# Altium schematic symbol library WR-TBL_Pluggable PCB Header.SchLib: 719 symbols (part 4 of 5)
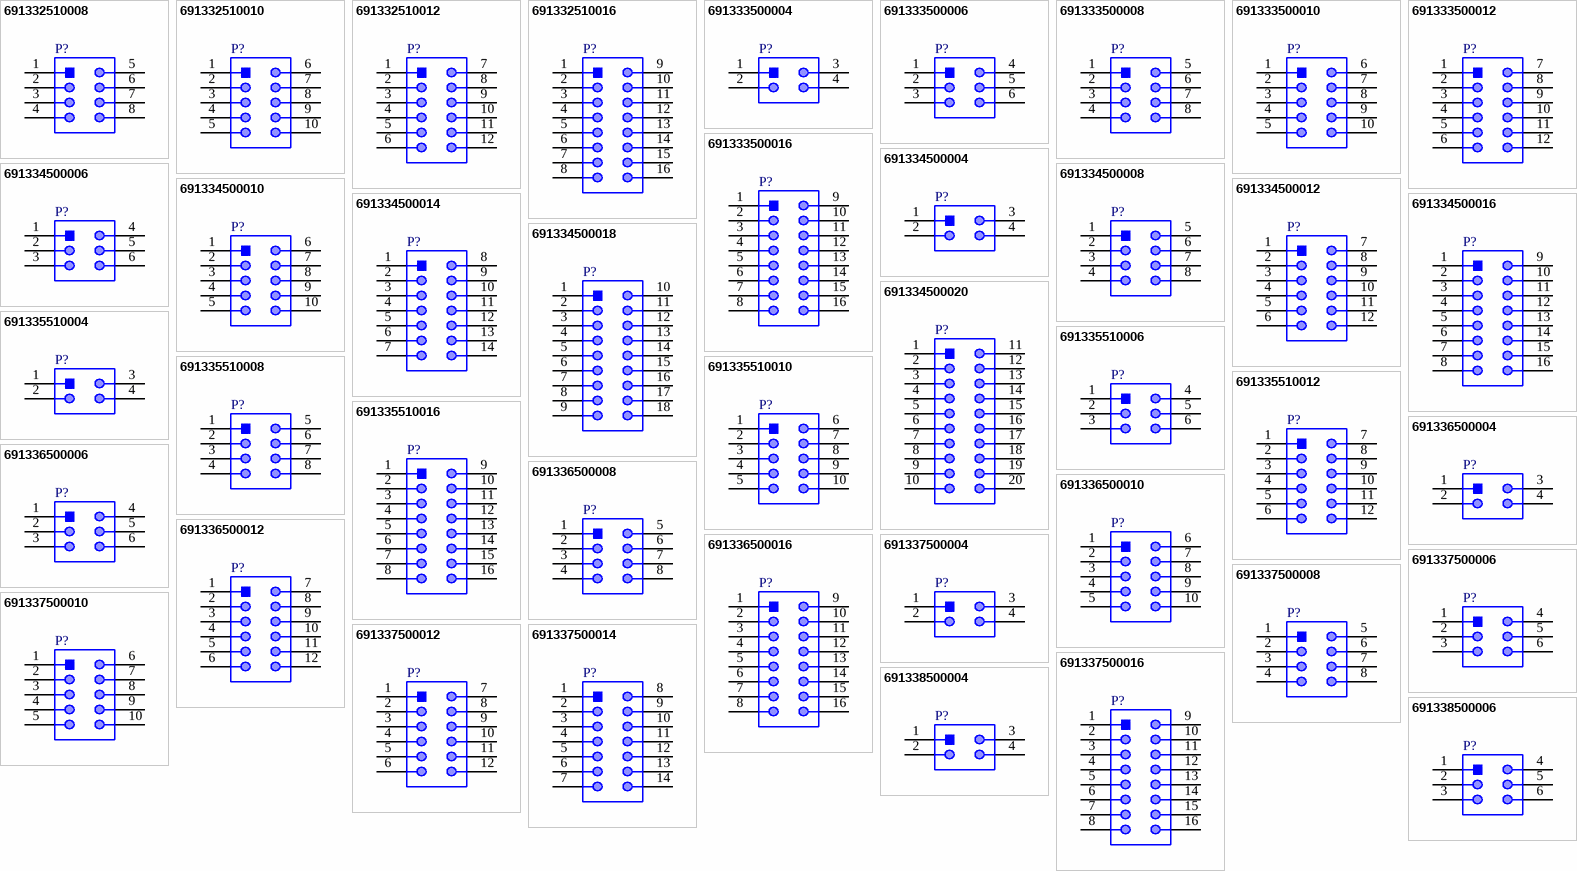
[diagram p20: symbols 691332510008 to 691338500006]

## 691334500020
designator P?
WR-TBL Serie 3345 Double Level Vertical PCB Header with Flanges & Nut Type, Pluggable, pitch 5.08mm, 20p; Part Number: 691334500020; Compliance: RoHS; Modularity: No; Pin Number: 20; Rated Current [UL]: 20A; Working Voltage [UL]: 300VAC; ComponentLink1Description: Manufacturer; ComponentLink1URL: http://www.we-online.de; ComponentLink2URL: https://katalog.we-online.de/em/datasheet/691334500020.pdf; ComponentLink2Description: Datasheet; Mounting Technology: THT; Packaging: Box; Operating Temperature: -40 to +105degC; PCB/Cable/Panel: PCB; Pitch: 5.08mm; Published Date: October 2019; Type: Double Level Vertical; Publisher: Wurth Elektronik; Application: Pluggable
footprint 691334500020
pins: 1, 2, 3, 4, 5, 6, 7, 8, 9, 10, 11, 12, 13, 14, 15, 16, 17, 18, 19, 20

## 691335510004
designator P?
WR-TBL Serie 3355 Double Level Horizontal PCB Header Modular, Pluggable, pitch 5.08mm, 4p; Part Number: 691335510004; Compliance: RoHS; Modularity: Yes; Pin Number: 4; Rated Current [UL]: 10A; Working Voltage [UL]: 300VAC; ComponentLink1Description: Manufacturer; ComponentLink1URL: http://www.we-online.de; ComponentLink2URL: https://katalog.we-online.de/em/datasheet/691335510004.pdf; ComponentLink2Description: Datasheet; Mounting Technology: THT; Packaging: Box; Operating Temperature: -40 to +105degC; PCB/Cable/Panel: PCB; Pitch: 5.08mm; Published Date: October 2019; Type: Double Level Horizontal; Publisher: Wurth Elektronik; Application: Pluggable
footprint 691335510004
pins: 1, 2, 3, 4

## 691335510006
designator P?
WR-TBL Serie 3355 Double Level Horizontal PCB Header Modular, Pluggable, pitch 5.08mm, 6p; Part Number: 691335510006; Compliance: RoHS; Modularity: Yes; Pin Number: 6; Rated Current [UL]: 10A; Working Voltage [UL]: 300VAC; ComponentLink1Description: Manufacturer; ComponentLink1URL: http://www.we-online.de; ComponentLink2URL: https://katalog.we-online.de/em/datasheet/691335510006.pdf; ComponentLink2Description: Datasheet; Mounting Technology: THT; Packaging: Box; Operating Temperature: -40 to +105degC; PCB/Cable/Panel: PCB; Pitch: 5.08mm; Published Date: October 2019; Type: Double Level Horizontal; Publisher: Wurth Elektronik; Application: Pluggable
footprint 691335510006
pins: 1, 2, 3, 4, 5, 6

## 691335510008
designator P?
WR-TBL Serie 3355 Double Level Horizontal PCB Header Modular, Pluggable, pitch 5.08mm, 8p; Part Number: 691335510008; Compliance: RoHS; Modularity: Yes; Pin Number: 8; Rated Current [UL]: 10A; Working Voltage [UL]: 300VAC; ComponentLink1Description: Manufacturer; ComponentLink1URL: http://www.we-online.de; ComponentLink2URL: https://katalog.we-online.de/em/datasheet/691335510008.pdf; ComponentLink2Description: Datasheet; Mounting Technology: THT; Packaging: Box; Operating Temperature: -40 to +105degC; PCB/Cable/Panel: PCB; Pitch: 5.08mm; Published Date: October 2019; Type: Double Level Horizontal; Publisher: Wurth Elektronik; Application: Pluggable
footprint 691335510008
pins: 1, 2, 3, 4, 5, 6, 7, 8

## 691335510010
designator P?
WR-TBL Serie 3355 Double Level Horizontal PCB Header Modular, Pluggable, pitch 5.08mm, 10p; Part Number: 691335510010; Compliance: RoHS; Modularity: Yes; Pin Number: 10; Rated Current [UL]: 10A; Working Voltage [UL]: 300VAC; ComponentLink1Description: Manufacturer; ComponentLink1URL: http://www.we-online.de; ComponentLink2URL: https://katalog.we-online.de/em/datasheet/691335510010.pdf; ComponentLink2Description: Datasheet; Mounting Technology: THT; Packaging: Box; Operating Temperature: -40 to +105degC; PCB/Cable/Panel: PCB; Pitch: 5.08mm; Published Date: October 2019; Type: Double Level Horizontal; Publisher: Wurth Elektronik; Application: Pluggable
footprint 691335510010
pins: 1, 2, 3, 4, 5, 6, 7, 8, 9, 10

## 691335510012
designator P?
WR-TBL Serie 3355 Double Level Horizontal PCB Header Modular, Pluggable, pitch 5.08mm, 12p; Part Number: 691335510012; Compliance: RoHS; Modularity: Yes; Pin Number: 12; Rated Current [UL]: 10A; Working Voltage [UL]: 300VAC; ComponentLink1Description: Manufacturer; ComponentLink1URL: http://www.we-online.de; ComponentLink2URL: https://katalog.we-online.de/em/datasheet/691335510012.pdf; ComponentLink2Description: Datasheet; Mounting Technology: THT; Packaging: Box; Operating Temperature: -40 to +105degC; PCB/Cable/Panel: PCB; Pitch: 5.08mm; Published Date: October 2019; Type: Double Level Horizontal; Publisher: Wurth Elektronik; Application: Pluggable
footprint 691335510012
pins: 1, 2, 3, 4, 5, 6, 7, 8, 9, 10, 11, 12

## 691335510016
designator P?
WR-TBL Serie 3355 Double Level Horizontal PCB Header Modular, Pluggable, pitch 5.08mm, 16p; Part Number: 691335510016; Compliance: RoHS; Modularity: Yes; Pin Number: 16; Rated Current [UL]: 10A; Working Voltage [UL]: 300VAC; ComponentLink1Description: Manufacturer; ComponentLink1URL: http://www.we-online.de; ComponentLink2URL: https://katalog.we-online.de/em/datasheet/691335510016.pdf; ComponentLink2Description: Datasheet; Mounting Technology: THT; Packaging: Box; Operating Temperature: -40 to +105degC; PCB/Cable/Panel: PCB; Pitch: 5.08mm; Published Date: October 2019; Type: Double Level Horizontal; Publisher: Wurth Elektronik; Application: Pluggable
footprint 691335510016
pins: 1, 2, 3, 4, 5, 6, 7, 8, 9, 10, 11, 12, 13, 14, 15, 16

## 691336500004
designator P?
WR-TBL Serie 3365 Double Level Vertical Header with Flanges, Pluggable, pitch 5.08mm, 4p; Part Number: 691336500004; Compliance: RoHS; Modularity: No; PCB/Cable/Panel: PCB; Pin Number: 4; Rated Current [UL]: 15A; Working Voltage [UL]: 300VAC; ComponentLink1Description: Manufacturer; ComponentLink1URL: http://www.we-online.de; ComponentLink2URL: https://katalog.we-online.de/em/datasheet/691336500004.pdf; ComponentLink2Description: Datasheet; Mounting Technology: THT; Packaging: Box; Operating Temperature: -40 to +105degC; Pitch: 5.08mm; Published Date: October 2019; Type: Double Level Vertical; Publisher: Wurth Elektronik; Application: Pluggable
footprint 691336500004
pins: 1, 2, 3, 4

## 691336500006
designator P?
WR-TBL Serie 3365 Double Level Vertical Header with Flanges, Pluggable, pitch 5.08mm, 6p; Part Number: 691336500006; Compliance: RoHS; Modularity: No; PCB/Cable/Panel: PCB; Pin Number: 6; Rated Current [UL]: 15A; Working Voltage [UL]: 300VAC; ComponentLink1Description: Manufacturer; ComponentLink1URL: http://www.we-online.de; ComponentLink2URL: https://katalog.we-online.de/em/datasheet/691336500006.pdf; ComponentLink2Description: Datasheet; Mounting Technology: THT; Packaging: Box; Operating Temperature: -40 to +105degC; Pitch: 5.08mm; Published Date: October 2019; Type: Double Level Vertical; Publisher: Wurth Elektronik; Application: Pluggable
footprint 691336500006
pins: 1, 2, 3, 4, 5, 6

## 691336500008
designator P?
WR-TBL Serie 3365 Double Level Vertical Header with Flanges, Pluggable, pitch 5.08mm, 8p; Part Number: 691336500008; Compliance: RoHS; Modularity: No; PCB/Cable/Panel: PCB; Pin Number: 8; Rated Current [UL]: 15A; Working Voltage [UL]: 300VAC; ComponentLink1Description: Manufacturer; ComponentLink1URL: http://www.we-online.de; ComponentLink2URL: https://katalog.we-online.de/em/datasheet/691336500008.pdf; ComponentLink2Description: Datasheet; Mounting Technology: THT; Packaging: Box; Operating Temperature: -40 to +105degC; Pitch: 5.08mm; Published Date: October 2019; Type: Double Level Vertical; Publisher: Wurth Elektronik; Application: Pluggable
footprint 691336500008
pins: 1, 2, 3, 4, 5, 6, 7, 8

## 691336500010
designator P?
WR-TBL Serie 3365 Double Level Vertical Header with Flanges, Pluggable, pitch 5.08mm, 10p; Part Number: 691336500010; Compliance: RoHS; Modularity: No; PCB/Cable/Panel: PCB; Pin Number: 10; Rated Current [UL]: 15A; Working Voltage [UL]: 300VAC; ComponentLink1Description: Manufacturer; ComponentLink1URL: http://www.we-online.de; ComponentLink2URL: https://katalog.we-online.de/em/datasheet/691336500010.pdf; ComponentLink2Description: Datasheet; Mounting Technology: THT; Packaging: Box; Operating Temperature: -40 to +105degC; Pitch: 5.08mm; Published Date: October 2019; Type: Double Level Vertical; Publisher: Wurth Elektronik; Application: Pluggable
footprint 691336500010
pins: 1, 2, 3, 4, 5, 6, 7, 8, 9, 10

## 691336500012
designator P?
WR-TBL Serie 3365 Double Level Vertical Header with Flanges, Pluggable, pitch 5.08mm, 12p; Part Number: 691336500012; Compliance: RoHS; Modularity: No; PCB/Cable/Panel: PCB; Pin Number: 12; Rated Current [UL]: 15A; Working Voltage [UL]: 300VAC; ComponentLink1Description: Manufacturer; ComponentLink1URL: http://www.we-online.de; ComponentLink2URL: https://katalog.we-online.de/em/datasheet/691336500012.pdf; ComponentLink2Description: Datasheet; Mounting Technology: THT; Packaging: Box; Operating Temperature: -40 to +105degC; Pitch: 5.08mm; Published Date: October 2019; Type: Double Level Vertical; Publisher: Wurth Elektronik; Application: Pluggable
footprint 691336500012
pins: 1, 2, 3, 4, 5, 6, 7, 8, 9, 10, 11, 12

## 691336500016
designator P?
WR-TBL Serie 3365 Double Level Vertical Header with Flanges, Pluggable, pitch 5.08mm, 16p; Part Number: 691336500016; Compliance: RoHS; Modularity: No; PCB/Cable/Panel: PCB; Pin Number: 16; Rated Current [UL]: 15A; Working Voltage [UL]: 300VAC; ComponentLink1Description: Manufacturer; ComponentLink1URL: http://www.we-online.de; ComponentLink2URL: https://katalog.we-online.de/em/datasheet/691336500016.pdf; ComponentLink2Description: Datasheet; Mounting Technology: THT; Packaging: Box; Operating Temperature: -40 to +105degC; Pitch: 5.08mm; Published Date: October 2019; Type: Double Level Vertical; Publisher: Wurth Elektronik; Application: Pluggable
footprint 691336500016
pins: 1, 2, 3, 4, 5, 6, 7, 8, 9, 10, 11, 12, 13, 14, 15, 16

## 691337500004
designator P?
WR-TBL Serie 3375 Double Level Vertical PCB Header with Flanges & Nut Type, Pluggable, pitch 5.08mm, 4p; Part Number: 691337500004; Compliance: RoHS; Modularity: No; Pin Number: 4; Rated Current [UL]: 10A; Working Voltage [UL]: 300VAC; ComponentLink1Description: Manufacturer; ComponentLink1URL: http://www.we-online.de; ComponentLink2URL: https://katalog.we-online.de/em/datasheet/691337500004.pdf; ComponentLink2Description: Datasheet; Mounting Technology: THT; Packaging: Box; Operating Temperature: -40 to +105degC; PCB/Cable/Panel: PCB; Pitch: 5.08mm; Published Date: October 2019; Type: Double Level Vertical; Publisher: Wurth Elektronik; Application: Pluggable
footprint 691337500004
pins: 1, 2, 3, 4

## 691337500006
designator P?
WR-TBL Serie 3375 Double Level Vertical PCB Header with Flanges & Nut Type, Pluggable, pitch 5.08mm, 6p; Part Number: 691337500006; Compliance: RoHS; Modularity: No; Pin Number: 6; Rated Current [UL]: 10A; Working Voltage [UL]: 300VAC; ComponentLink1Description: Manufacturer; ComponentLink1URL: http://www.we-online.de; ComponentLink2URL: https://katalog.we-online.de/em/datasheet/691337500006.pdf; ComponentLink2Description: Datasheet; Mounting Technology: THT; Packaging: Box; Operating Temperature: -40 to +105degC; PCB/Cable/Panel: PCB; Pitch: 5.08mm; Published Date: October 2019; Type: Double Level Vertical; Publisher: Wurth Elektronik; Application: Pluggable
footprint 691337500006
pins: 1, 2, 3, 4, 5, 6

## 691337500008
designator P?
WR-TBL Serie 3375 Double Level Vertical PCB Header with Flanges & Nut Type, Pluggable, pitch 5.08mm, 8p; Part Number: 691337500008; Compliance: RoHS; Modularity: No; Pin Number: 8; Rated Current [UL]: 10A; Working Voltage [UL]: 300VAC; ComponentLink1Description: Manufacturer; ComponentLink1URL: http://www.we-online.de; ComponentLink2URL: https://katalog.we-online.de/em/datasheet/691337500008.pdf; ComponentLink2Description: Datasheet; Mounting Technology: THT; Packaging: Box; Operating Temperature: -40 to +105degC; PCB/Cable/Panel: PCB; Pitch: 5.08mm; Published Date: October 2019; Type: Double Level Vertical; Publisher: Wurth Elektronik; Application: Pluggable
footprint 691337500008
pins: 1, 2, 3, 4, 5, 6, 7, 8

## 691337500010
designator P?
WR-TBL Serie 3375 Double Level Vertical PCB Header with Flanges & Nut Type, Pluggable, pitch 5.08mm, 10p; Part Number: 691337500010; Compliance: RoHS; Modularity: No; Pin Number: 10; Rated Current [UL]: 10A; Working Voltage [UL]: 300VAC; ComponentLink1Description: Manufacturer; ComponentLink1URL: http://www.we-online.de; ComponentLink2URL: https://katalog.we-online.de/em/datasheet/691337500010.pdf; ComponentLink2Description: Datasheet; Mounting Technology: THT; Packaging: Box; Operating Temperature: -40 to +105degC; PCB/Cable/Panel: PCB; Pitch: 5.08mm; Published Date: October 2019; Type: Double Level Vertical; Publisher: Wurth Elektronik; Application: Pluggable
footprint 691337500010
pins: 1, 2, 3, 4, 5, 6, 7, 8, 9, 10

## 691337500012
designator P?
WR-TBL Serie 3375 Double Level Vertical PCB Header with Flanges & Nut Type, Pluggable, pitch 5.08mm, 12p; Part Number: 691337500012; Compliance: RoHS; Modularity: No; Pin Number: 12; Rated Current [UL]: 10A; Working Voltage [UL]: 300VAC; ComponentLink1Description: Manufacturer; ComponentLink1URL: http://www.we-online.de; ComponentLink2URL: https://katalog.we-online.de/em/datasheet/691337500012.pdf; ComponentLink2Description: Datasheet; Mounting Technology: THT; Packaging: Box; Operating Temperature: -40 to +105degC; PCB/Cable/Panel: PCB; Pitch: 5.08mm; Published Date: October 2019; Type: Double Level Vertical; Publisher: Wurth Elektronik; Application: Pluggable
footprint 691337500012
pins: 1, 2, 3, 4, 5, 6, 7, 8, 9, 10, 11, 12

## 691337500014
designator P?
WR-TBL Serie 3375 Double Level Vertical PCB Header with Flanges & Nut Type, Pluggable, pitch 5.08mm, 14p; Part Number: 691337500014; Compliance: RoHS; Modularity: No; Pin Number: 14; Rated Current [UL]: 10A; Working Voltage [UL]: 300VAC; ComponentLink1Description: Manufacturer; ComponentLink1URL: http://www.we-online.de; ComponentLink2URL: https://katalog.we-online.de/em/datasheet/691337500014.pdf; ComponentLink2Description: Datasheet; Mounting Technology: THT; Packaging: Box; Operating Temperature: -40 to +105degC; PCB/Cable/Panel: PCB; Pitch: 5.08mm; Published Date: October 2019; Type: Double Level Vertical; Publisher: Wurth Elektronik; Application: Pluggable
footprint 691337500014
pins: 1, 2, 3, 4, 5, 6, 7, 8, 9, 10, 11, 12, 13, 14

## 691337500016
designator P?
WR-TBL Serie 3375 Double Level Vertical PCB Header with Flanges & Nut Type, Pluggable, pitch 5.08mm, 16p; Part Number: 691337500016; Compliance: RoHS; Modularity: No; Pin Number: 16; Rated Current [UL]: 10A; Working Voltage [UL]: 300VAC; ComponentLink1Description: Manufacturer; ComponentLink1URL: http://www.we-online.de; ComponentLink2URL: https://katalog.we-online.de/em/datasheet/691337500016.pdf; ComponentLink2Description: Datasheet; Mounting Technology: THT; Packaging: Box; Operating Temperature: -40 to +105degC; PCB/Cable/Panel: PCB; Pitch: 5.08mm; Published Date: October 2019; Type: Double Level Vertical; Publisher: Wurth Elektronik; Application: Pluggable
footprint 691337500016
pins: 1, 2, 3, 4, 5, 6, 7, 8, 9, 10, 11, 12, 13, 14, 15, 16

## 691338500004
designator P?
WR-TBL Serie 3385 Double Level Vertical PCB Header, Pluggable, pitch 5.08mm, 4p; Part Number: 691338500004; Compliance: RoHS; Modularity: No; Pin Number: 4; Rated Current [UL]: 15A; Working Voltage [UL]: 300VAC; ComponentLink1Description: Manufacturer; ComponentLink1URL: http://www.we-online.de; ComponentLink2URL: https://katalog.we-online.de/em/datasheet/691338500004.pdf; ComponentLink2Description: Datasheet; Mounting Technology: THT; Packaging: Box; Operating Temperature: -40 to +105degC; PCB/Cable/Panel: PCB; Pitch: 5.08mm; Published Date: October 2019; Type: Double Level Vertical; Publisher: Wurth Elektronik; Application: Pluggable
footprint 691338500004
pins: 1, 2, 3, 4

## 691338500006
designator P?
WR-TBL Serie 3385 Double Level Vertical PCB Header, Pluggable, pitch 5.08mm, 6p; Part Number: 691338500006; Compliance: RoHS; Modularity: No; Pin Number: 6; Rated Current [UL]: 15A; Working Voltage [UL]: 300VAC; ComponentLink1Description: Manufacturer; ComponentLink1URL: http://www.we-online.de; ComponentLink2URL: https://katalog.we-online.de/em/datasheet/691338500006.pdf; ComponentLink2Description: Datasheet; Mounting Technology: THT; Packaging: Box; Operating Temperature: -40 to +105degC; PCB/Cable/Panel: PCB; Pitch: 5.08mm; Published Date: October 2019; Type: Double Level Vertical; Publisher: Wurth Elektronik; Application: Pluggable
footprint 691338500006
pins: 1, 2, 3, 4, 5, 6

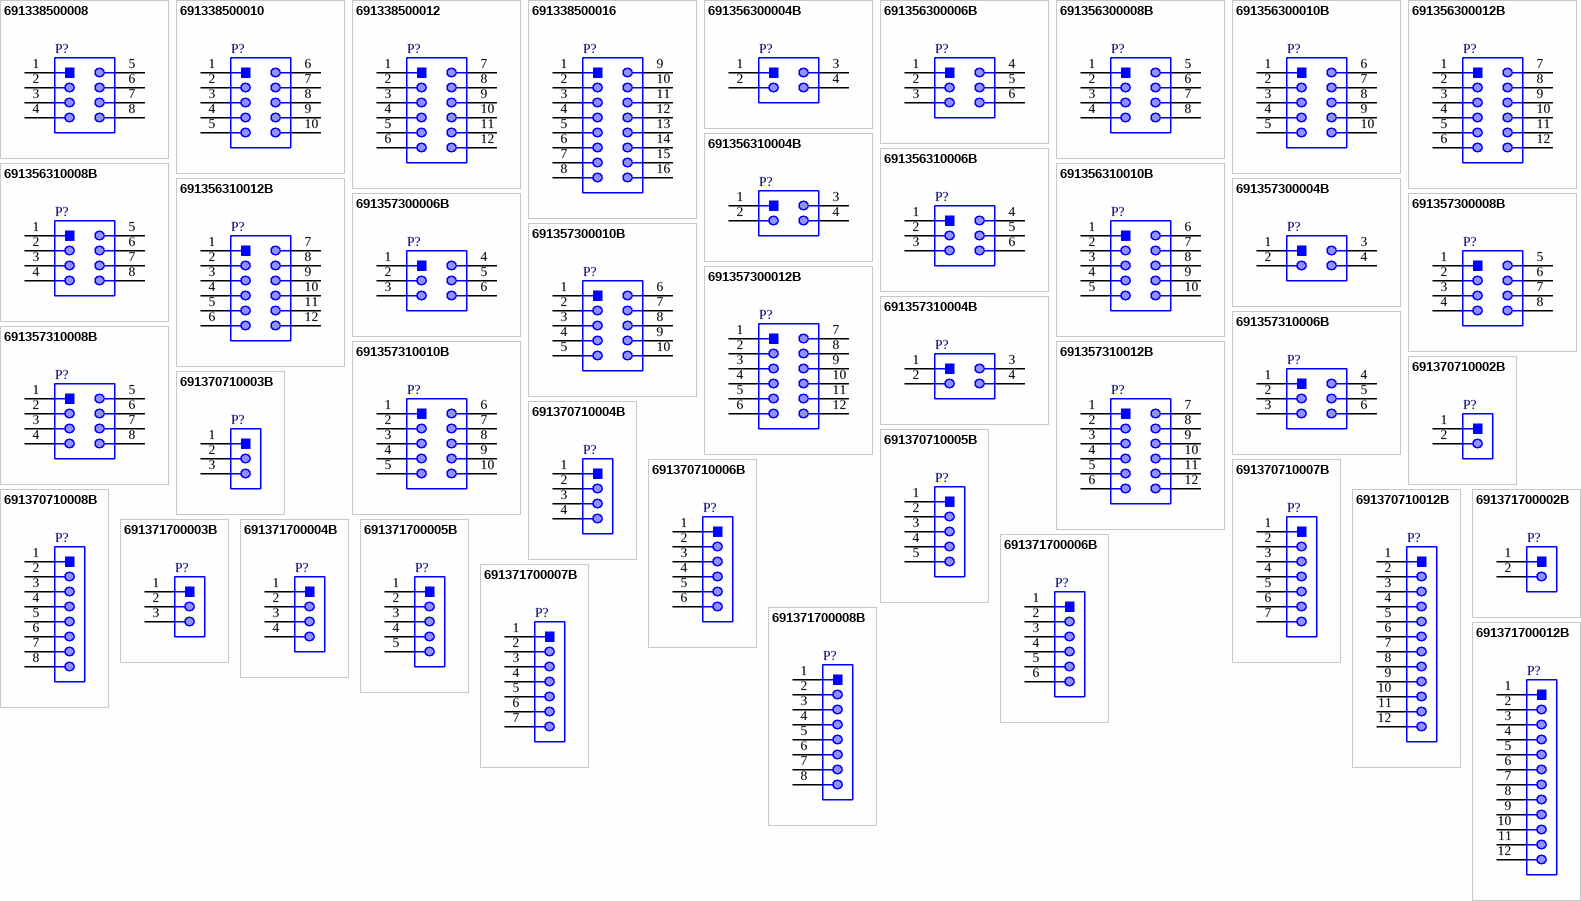
[diagram p13: symbols 691338500008 to 691371700012B]

## 691338500008
designator P?
WR-TBL Serie 3385 Double Level Vertical PCB Header, Pluggable, pitch 5.08mm, 8p; Part Number: 691338500008; Compliance: RoHS; Modularity: No; Pin Number: 8; Rated Current [UL]: 15A; Working Voltage [UL]: 300VAC; ComponentLink1Description: Manufacturer; ComponentLink1URL: http://www.we-online.de; ComponentLink2URL: https://katalog.we-online.de/em/datasheet/691338500008.pdf; ComponentLink2Description: Datasheet; Mounting Technology: THT; Packaging: Box; Operating Temperature: -40 to +105degC; PCB/Cable/Panel: PCB; Pitch: 5.08mm; Published Date: October 2019; Type: Double Level Vertical; Publisher: Wurth Elektronik; Application: Pluggable
footprint 691338500008
pins: 1, 2, 3, 4, 5, 6, 7, 8

## 691338500010
designator P?
WR-TBL Serie 3385 Double Level Vertical PCB Header, Pluggable, pitch 5.08mm, 10p; Part Number: 691338500010; Compliance: RoHS; Modularity: No; Pin Number: 10; Rated Current [UL]: 15A; Working Voltage [UL]: 300VAC; ComponentLink1Description: Manufacturer; ComponentLink1URL: http://www.we-online.de; ComponentLink2URL: https://katalog.we-online.de/em/datasheet/691338500010.pdf; ComponentLink2Description: Datasheet; Mounting Technology: THT; Packaging: Box; Operating Temperature: -40 to +105degC; PCB/Cable/Panel: PCB; Pitch: 5.08mm; Published Date: October 2019; Type: Double Level Vertical; Publisher: Wurth Elektronik; Application: Pluggable
footprint 691338500010
pins: 1, 2, 3, 4, 5, 6, 7, 8, 9, 10

## 691338500012
designator P?
WR-TBL Serie 3385 Double Level Vertical PCB Header, Pluggable, pitch 5.08mm, 12p; Part Number: 691338500012; Compliance: RoHS; Modularity: No; Pin Number: 12; Rated Current [UL]: 15A; Working Voltage [UL]: 300VAC; ComponentLink1Description: Manufacturer; ComponentLink1URL: http://www.we-online.de; ComponentLink2URL: https://katalog.we-online.de/em/datasheet/691338500012.pdf; ComponentLink2Description: Datasheet; Mounting Technology: THT; Packaging: Box; Operating Temperature: -40 to +105degC; PCB/Cable/Panel: PCB; Pitch: 5.08mm; Published Date: October 2019; Type: Double Level Vertical; Publisher: Wurth Elektronik; Application: Pluggable
footprint 691338500012
pins: 1, 2, 3, 4, 5, 6, 7, 8, 9, 10, 11, 12

## 691338500016
designator P?
WR-TBL Serie 3385 Double Level Vertical PCB Header, Pluggable, pitch 5.08mm, 16p; Part Number: 691338500016; Compliance: RoHS; Modularity: No; Pin Number: 16; Rated Current [UL]: 15A; Working Voltage [UL]: 300VAC; ComponentLink1Description: Manufacturer; ComponentLink1URL: http://www.we-online.de; ComponentLink2URL: https://katalog.we-online.de/em/datasheet/691338500016.pdf; ComponentLink2Description: Datasheet; Mounting Technology: THT; Packaging: Box; Operating Temperature: -40 to +105degC; PCB/Cable/Panel: PCB; Pitch: 5.08mm; Published Date: October 2019; Type: Double Level Vertical; Publisher: Wurth Elektronik; Application: Pluggable
footprint 691338500016
pins: 1, 2, 3, 4, 5, 6, 7, 8, 9, 10, 11, 12, 13, 14, 15, 16

## 691356300004B
designator P?
WR-TBL Serie 356B Double Level Vertical PCB Header, Pluggable, pitch 3.81mm, 4p; Part Number: 691356300004B; Compliance: RoHS; Modularity: No; Pin Number: 4; Rated Current [UL]: 10A; Working Voltage [UL]: 300VAC; ComponentLink1Description: Manufacturer; ComponentLink1URL: http://www.we-online.de; ComponentLink2URL: https://katalog.we-online.de/em/datasheet/691356300004B.pdf; ComponentLink2Description: Datasheet; Mounting Technology: THT; Packaging: Box; Operating Temperature: -40 to +105degC; PCB/Cable/Panel: PCB; Pitch: 3.81mm; Published Date: October 2019; Type: Double Level Vertical; Publisher: Wurth Elektronik; Application: Pluggable
footprint 691356300004B
pins: 1, 2, 3, 4

## 691356300006B
designator P?
WR-TBL Serie 356B Double Level Vertical PCB Header, Pluggable, pitch 3.81mm, 6p; Part Number: 691356300006B; Compliance: RoHS; Modularity: No; Pin Number: 6; Rated Current [UL]: 10A; Working Voltage [UL]: 300VAC; ComponentLink1Description: Manufacturer; ComponentLink1URL: http://www.we-online.de; ComponentLink2URL: https://katalog.we-online.de/em/datasheet/691356300006B.pdf; ComponentLink2Description: Datasheet; Mounting Technology: THT; Packaging: Box; Operating Temperature: -40 to +105degC; PCB/Cable/Panel: PCB; Pitch: 3.81mm; Published Date: October 2019; Type: Double Level Vertical; Publisher: Wurth Elektronik; Application: Pluggable
footprint 691356300006B
pins: 1, 2, 3, 4, 5, 6

## 691356300008B
designator P?
WR-TBL Serie 356B Double Level Vertical PCB Header, Pluggable, pitch 3.81mm, 8p; Part Number: 691356300008B; Compliance: RoHS; Modularity: No; Pin Number: 8; Rated Current [UL]: 10A; Working Voltage [UL]: 300VAC; ComponentLink1Description: Manufacturer; ComponentLink1URL: http://www.we-online.de; ComponentLink2URL: https://katalog.we-online.de/em/datasheet/691356300008B.pdf; ComponentLink2Description: Datasheet; Mounting Technology: THT; Packaging: Box; Operating Temperature: -40 to +105degC; PCB/Cable/Panel: PCB; Pitch: 3.81mm; Published Date: October 2019; Type: Double Level Vertical; Publisher: Wurth Elektronik; Application: Pluggable
footprint 691356300008B
pins: 1, 2, 3, 4, 5, 6, 7, 8

## 691356300010B
designator P?
WR-TBL Serie 356B Double Level Vertical PCB Header, Pluggable, pitch 3.81mm, 10p; Part Number: 691356300010B; Compliance: RoHS; Modularity: No; Pin Number: 10; Rated Current [UL]: 10A; Working Voltage [UL]: 300VAC; ComponentLink1Description: Manufacturer; ComponentLink1URL: http://www.we-online.de; ComponentLink2URL: https://katalog.we-online.de/em/datasheet/691356300010B.pdf; ComponentLink2Description: Datasheet; Mounting Technology: THT; Packaging: Box; Operating Temperature: -40 to +105degC; PCB/Cable/Panel: PCB; Pitch: 3.81mm; Published Date: October 2019; Type: Double Level Vertical; Publisher: Wurth Elektronik; Application: Pluggable
footprint 691356300010B
pins: 1, 2, 3, 4, 5, 6, 7, 8, 9, 10

## 691356300012B
designator P?
WR-TBL Serie 356B Double Level Vertical PCB Header, Pluggable, pitch 3.81mm, 12p; Part Number: 691356300012B; Compliance: RoHS; Modularity: No; Pin Number: 12; Rated Current [UL]: 10A; Working Voltage [UL]: 300VAC; ComponentLink1Description: Manufacturer; ComponentLink1URL: http://www.we-online.de; ComponentLink2URL: https://katalog.we-online.de/em/datasheet/691356300012B.pdf; ComponentLink2Description: Datasheet; Mounting Technology: THT; Packaging: Box; Operating Temperature: -40 to +105degC; PCB/Cable/Panel: PCB; Pitch: 3.81mm; Published Date: October 2019; Type: Double Level Vertical; Publisher: Wurth Elektronik; Application: Pluggable
footprint 691356300012B
pins: 1, 2, 3, 4, 5, 6, 7, 8, 9, 10, 11, 12

## 691356310004B
designator P?
WR-TBL Serie 356B Double Level Horizontal PCB Header, Pluggable, pitch 3.81mm, 4p; Part Number: 691356310004B; Compliance: RoHS; Modularity: No; Pin Number: 4; Rated Current [UL]: 10A; Working Voltage [UL]: 300VAC; ComponentLink1Description: Manufacturer; ComponentLink1URL: http://www.we-online.de; ComponentLink2URL: https://katalog.we-online.de/em/datasheet/691356310004B.pdf; ComponentLink2Description: Datasheet; Mounting Technology: THT; Packaging: Box; Operating Temperature: -40 to +105degC; PCB/Cable/Panel: PCB; Pitch: 3.81mm; Published Date: October 2019; Type: Double Level Horizontal; Publisher: Wurth Elektronik; Application: Pluggable
footprint 691356310004B
pins: 1, 2, 3, 4

## 691356310006B
designator P?
WR-TBL Serie 356B Double Level Horizontal PCB Header, Pluggable, pitch 3.81mm, 6p; Part Number: 691356310006B; Compliance: RoHS; Modularity: No; Pin Number: 6; Rated Current [UL]: 10A; Working Voltage [UL]: 300VAC; ComponentLink1Description: Manufacturer; ComponentLink1URL: http://www.we-online.de; ComponentLink2URL: https://katalog.we-online.de/em/datasheet/691356310006B.pdf; ComponentLink2Description: Datasheet; Mounting Technology: THT; Packaging: Box; Operating Temperature: -40 to +105degC; PCB/Cable/Panel: PCB; Pitch: 3.81mm; Published Date: October 2019; Type: Double Level Horizontal; Publisher: Wurth Elektronik; Application: Pluggable
footprint 691356310006B
pins: 1, 2, 3, 4, 5, 6

## 691356310008B
designator P?
WR-TBL Serie 356B Double Level Horizontal PCB Header, Pluggable, pitch 3.81mm, 8p; Part Number: 691356310008B; Compliance: RoHS; Modularity: No; Pin Number: 8; Rated Current [UL]: 10A; Working Voltage [UL]: 300VAC; ComponentLink1Description: Manufacturer; ComponentLink1URL: http://www.we-online.de; ComponentLink2URL: https://katalog.we-online.de/em/datasheet/691356310008B.pdf; ComponentLink2Description: Datasheet; Mounting Technology: THT; Packaging: Box; Operating Temperature: -40 to +105degC; PCB/Cable/Panel: PCB; Pitch: 3.81mm; Published Date: October 2019; Type: Double Level Horizontal; Publisher: Wurth Elektronik; Application: Pluggable
footprint 691356310008B
pins: 1, 2, 3, 4, 5, 6, 7, 8
